# Altium footprint library PassiveComponents.PcbLib: 111 footprints (part 6 of 7)
Each footprint in its own frame and in the unit in brackets; x right, y up, seen from the top. Pads: shape width x height; smd on the part's side, far side on the other; paste and mask are expansions set on the pad; w line width, h text height; cw(c..) or ccw(c..) is an arc to the next point about the centre after c.
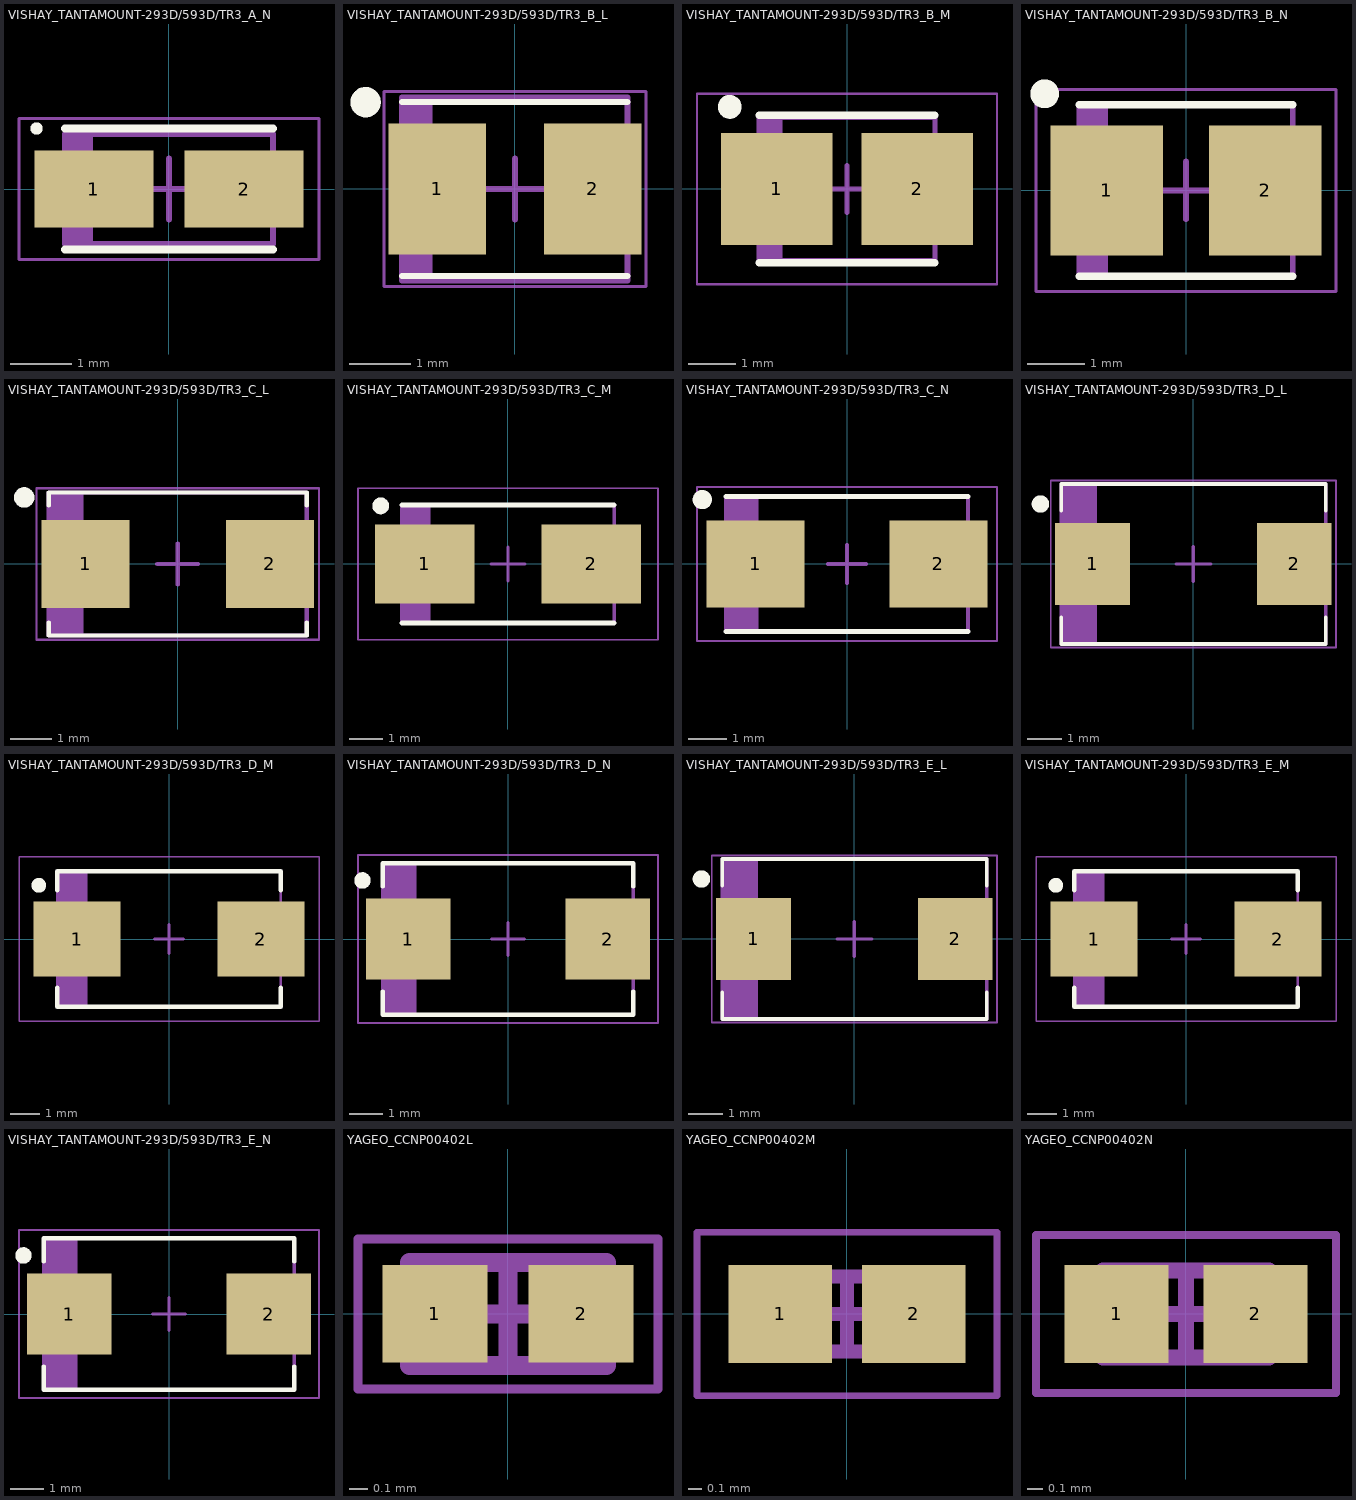
[diagram p5: the footprints below, top view; thin cyan lines are the x and y axes]

## VISHAY_TANTAMOUNT-293D/593D/TR3_A_N [mm] "Molded Capacitor, 2-Leads, Body 3.20x1.60mm, IPC Medium Density"
height 1.8
pads (2):
  rect 1.95x1.25 smd mask+0.05: 1(-1.225,0) 2(1.225,0)
Top Overlay:
  circle w0.1: c-2.163,0.988 r0.05
  lines w0.127: -1.7,-0.989 1.7,-0.989 ; -1.7,0.989 1.7,0.989
Top Assembly:
  rectangle: -1.7,-0.9 -1.243,0.9
  lines w0.1: -1.7,-0.9 -1.7,0.9 1.7,0.9 1.7,-0.9 -1.7,-0.9
  text "'.Designator'" at -1.209,-0.113 h0.5
Top Courtyard:
  lines w0.05: -2.45,-1.15 -2.45,1.15 2.45,1.15 2.45,-1.15 -2.45,-1.15
  lines w0.1: -0.5,0 0.5,0 ; 0,-0.5 0,0.5
3D body "CAPMP3216X18N.step": height 1.8, standoff 0, extent -1.92,-0.9 1.92,0.9

## VISHAY_TANTAMOUNT-293D/593D/TR3_B_L [mm] "Molded Capacitor, 2-Leads, Body 3.50x2.80mm, IPC High Density"
height 2.1
pads (2):
  rect 1.6x2.15 smd mask+0.05: 1(-1.275,0) 2(1.275,0)
Top Overlay:
  circle w0.25: c-2.451,1.426 r0.125
  lines w0.102: -1.85,-1.426 1.85,-1.426 ; -1.85,1.426 1.85,1.426
Top Assembly:
  rectangle: -1.85,-1.5 -1.352,1.5
  lines w0.1: -1.85,-1.5 -1.85,1.5 1.85,1.5 1.85,-1.5 -1.85,-1.5
  text "'.Designator'" at -1.209,-0.113 h0.5
Top Courtyard:
  lines w0.05: -2.15,-1.6 -2.15,1.6 2.15,1.6 2.15,-1.6 -2.15,-1.6
  lines w0.1: -0.5,0 0.5,0 ; 0,-0.5 0,0.5
3D body "CAPMP3528X21L.step": height 2.1, standoff 0, extent -2.07,-1.5 2.07,1.5

## VISHAY_TANTAMOUNT-293D/593D/TR3_B_M [mm] "Molded Capacitor, 2-Leads, Body 3.50x2.80mm, IPC Low Density"
height 2.1
pads (2):
  rect 2.35x2.35 smd mask+0.05: 1(-1.475,0) 2(1.475,0)
Top Overlay:
  circle w0.25: c-2.464,1.725 r0.125
  lines w0.152: -1.85,-1.551 1.85,-1.551 ; -1.85,1.551 1.85,1.551
Top Assembly:
  rectangle: -1.85,-1.5 -1.352,1.5
  lines w0.1: -1.85,-1.5 1.85,-1.5 1.85,1.5 -1.85,1.5 -1.85,-1.5
  text "'.Designator'" at -1.209,-0.113 h0.5
Top Courtyard:
  lines w0.05: -3.15,-2 3.15,-2 3.15,2 -3.15,2 -3.15,-2
  lines w0.1: -0.5,0 0.5,0 ; 0,-0.5 0,0.5
3D body "CAPMP3528X21M.step": height 2.1, standoff 0, extent -2.07,-1.5 2.07,1.5

## VISHAY_TANTAMOUNT-293D/593D/TR3_B_N [mm] "Molded Capacitor, 2-Leads, Body 3.50x2.80mm, IPC Medium Density"
height 2.1
pads (2):
  rect 1.95x2.25 smd mask+0.05: 1(-1.375,0) 2(1.375,0)
Top Overlay:
  circle w0.25: c-2.449,1.675 r0.125
  lines w0.127: -1.85,-1.488 1.85,-1.488 ; -1.85,1.488 1.85,1.488
Top Assembly:
  rectangle: -1.85,-1.5 -1.352,1.5
  lines w0.1: -1.85,-1.5 1.85,-1.5 1.85,1.5 -1.85,1.5 -1.85,-1.5
  text "'.Designator'" at -1.209,-0.113 h0.5
Top Courtyard:
  lines w0.05: -2.6,-1.75 2.6,-1.75 2.6,1.75 -2.6,1.75 -2.6,-1.75
  lines w0.1: -0.5,0 0.5,0 ; 0,-0.5 0,0.5
3D body "CAPMP3528X21N.step": height 2.1, standoff 0, extent -2.07,-1.5 2.07,1.5

## VISHAY_TANTAMOUNT-293D/593D/TR3_C_L [mm] "Molded Capacitor, 2-Leads, Body 6.00x3.20mm, IPC High Density"
height 2.8
pads (2):
  rect 2.15x2.15 smd mask+0.05: 1(-2.25,0) 2(2.25,0)
Top Overlay:
  circle w0.25: c-3.751,1.625 r0.125
  lines w0.102: -3.15,-1.426 -3.15,-1.75 3.15,-1.75 3.15,-1.426 ; -3.15,1.426 -3.15,1.75 3.15,1.75 3.15,1.426
Top Assembly:
  rectangle: -3.15,-1.75 -2.303,1.75
  lines w0.1: -3.15,-1.75 -3.15,1.75 3.15,1.75 3.15,-1.75 -3.15,-1.75
  text "'.Designator'" at -1.209,-0.113 h0.5
Top Courtyard:
  lines w0.05: -3.45,-1.85 -3.45,1.85 3.45,1.85 3.45,-1.85 -3.45,-1.85
  lines w0.1: -0.5,0 0.5,0 ; 0,-0.5 0,0.5
3D body "CAPMP6032X28L.step": height 2.8, standoff 0, extent -3.37,-1.75 3.37,1.75

## VISHAY_TANTAMOUNT-293D/593D/TR3_C_M [mm] "Molded Capacitor, 2-Leads, Body 6.00x3.20mm, IPC Low Density"
height 2.8
pads (2):
  rect 2.95x2.35 smd mask+0.05: 1(-2.475,0) 2(2.475,0)
Top Overlay:
  circle w0.25: c-3.776,1.725 r0.125
  lines w0.152: -3.15,-1.75 3.15,-1.75 ; -3.15,1.75 3.15,1.75
Top Assembly:
  rectangle: -3.15,-1.75 -2.303,1.75
  lines w0.1: -3.15,-1.75 3.15,-1.75 3.15,1.75 -3.15,1.75 -3.15,-1.75
  text "'.Designator'" at -1.209,-0.113 h0.5
Top Courtyard:
  lines w0.05: -4.45,-2.25 4.45,-2.25 4.45,2.25 -4.45,2.25 -4.45,-2.25
  lines w0.1: -0.5,0 0.5,0 ; 0,-0.5 0,0.5
3D body "CAPMP6032X28M.step": height 2.8, standoff 0, extent -3.37,-1.75 3.37,1.75

## VISHAY_TANTAMOUNT-293D/593D/TR3_C_N [mm] "Molded Capacitor, 2-Leads, Body 6.00x3.20mm, IPC Medium Density"
height 2.8
pads (2):
  rect 2.55x2.25 smd mask+0.05: 1(-2.375,0) 2(2.375,0)
Top Overlay:
  circle w0.25: c-3.763,1.675 r0.125
  lines w0.127: -3.15,-1.75 3.15,-1.75 ; -3.15,1.75 3.15,1.75
Top Assembly:
  rectangle: -3.15,-1.75 -2.303,1.75
  lines w0.1: -3.15,-1.75 -3.15,1.75 3.15,1.75 3.15,-1.75 -3.15,-1.75
  text "'.Designator'" at -1.209,-0.113 h0.5
Top Courtyard:
  lines w0.05: -3.9,-2 -3.9,2 3.9,2 3.9,-2 -3.9,-2
  lines w0.1: -0.5,0 0.5,0 ; 0,-0.5 0,0.5
3D body "CAPMP6032X28N.step": height 2.8, standoff 0, extent -3.32,-1.7 3.32,1.7

## VISHAY_TANTAMOUNT-293D/593D/TR3_D_L [mm] "Molded Capacitor, 2-Leads, Body 7.30x4.30mm, IPC High Density"
height 3.1
pads (2):
  rect 2.15x2.35 smd mask+0.05: 1(-2.9,0) 2(2.9,0)
Top Overlay:
  circle w0.25: c-4.401,1.725 r0.125
  lines w0.102: -3.8,-1.526 -3.8,-2.3 3.8,-2.3 3.8,-1.526 ; -3.8,1.526 -3.8,2.3 3.8,2.3 3.8,1.526
Top Assembly:
  rectangle: -3.8,-2.3 -2.778,2.3
  lines w0.1: -3.8,-2.3 3.8,-2.3 3.8,2.3 -3.8,2.3 -3.8,-2.3
  text "'.Designator'" at -1.209,-0.113 h0.5
Top Courtyard:
  lines w0.05: -4.1,-2.4 4.1,-2.4 4.1,2.4 -4.1,2.4 -4.1,-2.4
  lines w0.1: -0.5,0 0.5,0 ; 0,-0.5 0,0.5
3D body "CAPMP7343X31L.step": height 3.1, standoff 0, extent -4.02,-2.3 4.02,2.3

## VISHAY_TANTAMOUNT-293D/593D/TR3_D_M [mm] "Molded Capacitor, 2-Leads, Body 7.30x4.30mm, IPC Low Density"
height 3.1
pads (2):
  rect 2.95x2.55 smd mask+0.05: 1(-3.125,0) 2(3.125,0)
Top Overlay:
  circle w0.25: c-4.426,1.825 r0.125
  lines w0.152: -3.8,-1.651 -3.8,-2.3 3.8,-2.3 3.8,-1.651 ; -3.8,1.651 -3.8,2.3 3.8,2.3 3.8,1.651
Top Assembly:
  rectangle: -3.8,-2.3 -2.778,2.3
  lines w0.1: -3.8,-2.3 -3.8,2.3 3.8,2.3 3.8,-2.3 -3.8,-2.3
  text "'.Designator'" at -1.209,-0.113 h0.5
Top Courtyard:
  lines w0.05: -5.1,-2.8 -5.1,2.8 5.1,2.8 5.1,-2.8 -5.1,-2.8
  lines w0.1: -0.5,0 0.5,0 ; 0,-0.5 0,0.5
3D body "CAPMP7343X31M.step": height 3.1, standoff 0, extent -3.97,-2.2 3.97,2.2

## VISHAY_TANTAMOUNT-293D/593D/TR3_D_N [mm] "Molded Capacitor, 2-Leads, Body 7.30x4.30mm, IPC Medium Density"
height 3.1
pads (2):
  rect 2.55x2.45 smd mask+0.05: 1(-3.025,0) 2(3.025,0)
Top Overlay:
  circle w0.25: c-4.414,1.775 r0.125
  lines w0.127: -3.8,-1.588 -3.8,-2.3 3.8,-2.3 3.8,-1.588 ; -3.8,1.588 -3.8,2.3 3.8,2.3 3.8,1.588
Top Assembly:
  rectangle: -3.8,-2.3 -2.778,2.3
  lines w0.1: -3.8,-2.3 3.8,-2.3 3.8,2.3 -3.8,2.3 -3.8,-2.3
  text "'.Designator'" at -1.209,-0.113 h0.5
Top Courtyard:
  lines w0.05: -4.55,-2.55 4.55,-2.55 4.55,2.55 -4.55,2.55 -4.55,-2.55
  lines w0.1: -0.5,0 0.5,0 ; 0,-0.5 0,0.5
3D body "CAPMP7343X31N.step": height 3.1, standoff 0, extent -4.02,-2.3 4.02,2.3

## VISHAY_TANTAMOUNT-293D/593D/TR3_E_L [mm] "Molded Capacitor, 2-Leads, Body 7.30x4.30mm, IPC High Density"
height 4.3
pads (2):
  rect 2.15x2.35 smd mask+0.05: 1(-2.9,0) 2(2.9,0)
Top Overlay:
  circle w0.25: c-4.401,1.725 r0.125
  lines w0.102: -3.8,-1.526 -3.8,-2.3 3.8,-2.3 3.8,-1.526 ; -3.8,1.526 -3.8,2.3 3.8,2.3 3.8,1.526
Top Assembly:
  rectangle: -3.8,-2.3 -2.778,2.3
  lines w0.1: -3.8,-2.3 3.8,-2.3 3.8,2.3 -3.8,2.3 -3.8,-2.3
  text "'.Designator'" at -1.209,-0.113 h0.5
Top Courtyard:
  lines w0.05: -4.1,-2.4 4.1,-2.4 4.1,2.4 -4.1,2.4 -4.1,-2.4
  lines w0.1: -0.5,0 0.5,0 ; 0,-0.5 0,0.5
3D body "CAPMP7343X43L.step": height 4.3, standoff 0, extent -4.02,-2.3 4.02,2.3

## VISHAY_TANTAMOUNT-293D/593D/TR3_E_M [mm] "Molded Capacitor, 2-Leads, Body 7.30x4.30mm, IPC Low Density"
height 4.3
pads (2):
  rect 2.95x2.55 smd mask+0.05: 1(-3.125,0) 2(3.125,0)
Top Overlay:
  circle w0.25: c-4.426,1.825 r0.125
  lines w0.152: -3.8,-1.651 -3.8,-2.3 3.8,-2.3 3.8,-1.651 ; -3.8,1.651 -3.8,2.3 3.8,2.3 3.8,1.651
Top Assembly:
  rectangle: -3.8,-2.3 -2.778,2.3
  lines w0.1: -3.8,-2.3 -3.8,2.3 3.8,2.3 3.8,-2.3 -3.8,-2.3
  text "'.Designator'" at -1.209,-0.113 h0.5
Top Courtyard:
  lines w0.05: -5.1,-2.8 -5.1,2.8 5.1,2.8 5.1,-2.8 -5.1,-2.8
  lines w0.1: -0.5,0 0.5,0 ; 0,-0.5 0,0.5
3D body "CAPMP7343X43M.step": height 4.3, standoff 0, extent -4.02,-2.3 4.02,2.3

## VISHAY_TANTAMOUNT-293D/593D/TR3_E_N [mm] "Molded Capacitor, 2-Leads, Body 7.30x4.30mm, IPC Medium Density"
height 4.3
pads (2):
  rect 2.55x2.45 smd mask+0.05: 1(-3.025,0) 2(3.025,0)
Top Overlay:
  circle w0.25: c-4.414,1.775 r0.125
  lines w0.127: -3.8,-1.588 -3.8,-2.3 3.8,-2.3 3.8,-1.588 ; -3.8,1.588 -3.8,2.3 3.8,2.3 3.8,1.588
Top Assembly:
  rectangle: -3.8,-2.3 -2.778,2.3
  lines w0.1: -3.8,-2.3 -3.8,2.3 3.8,2.3 3.8,-2.3 -3.8,-2.3
  text "'.Designator'" at -1.209,-0.113 h0.5
Top Courtyard:
  lines w0.05: -4.55,-2.55 -4.55,2.55 4.55,2.55 4.55,-2.55 -4.55,-2.55
  lines w0.1: -0.5,0 0.5,0 ; 0,-0.5 0,0.5
3D body "CAPMP7343X43N.step": height 4.3, standoff 0, extent -4.02,-2.3 4.02,2.3

## YAGEO_CCNP00402L [mm] "Chip Capacitor, 2-Leads, Body 1.00x0.50mm, IPC High Density"
height 0.55
pads (2):
  rect 0.56x0.52 smd mask+0.05: 1(-0.39,0) 2(0.39,0)
Top Assembly:
  lines w0.1: -0.525,-0.275 -0.525,0.275 0.525,0.275 0.525,-0.275 -0.525,-0.275
  text "'.Designator'" at -0.483,-0.045 h0.2
Top Courtyard:
  lines w0.05: -0.8,-0.4 -0.8,0.4 0.8,0.4 0.8,-0.4 -0.8,-0.4
  lines w0.1: -0.275,0 0.275,0 ; 0,-0.275 0,0.275
3D body "CAPC1005X06L.step": height 0.55, standoff 0, extent -0.525,-0.275 0.525,0.275

## YAGEO_CCNP00402M [mm] "Chip Capacitor, 2-Leads, Body 1.00x0.50mm, IPC Low Density"
height 0.55
pads (2):
  rect 0.76x0.72 smd mask+0.05: 1(-0.49,0) 2(0.49,0)
Top Assembly:
  lines w0.1: -0.525,-0.275 0.525,-0.275 0.525,0.275 -0.525,0.275 -0.525,-0.275
  text "'.Designator'" at -0.483,-0.045 h0.2
Top Courtyard:
  lines w0.05: -1.1,-0.6 1.1,-0.6 1.1,0.6 -1.1,0.6 -1.1,-0.6
  lines w0.1: -0.275,0 0.275,0 ; 0,-0.275 0,0.275
3D body "CAPC1005X06M.step": height 0.55, standoff 0, extent -0.525,-0.275 0.525,0.275

## YAGEO_CCNP00402N [mm] "Chip Capacitor, 2-Leads, Body 1.00x0.50mm, IPC Medium Density"
height 0.55
pads (2):
  rect 0.66x0.62 smd mask+0.05: 1(-0.44,0) 2(0.44,0)
Top Assembly:
  lines w0.1: -0.525,-0.275 0.525,-0.275 0.525,0.275 -0.525,0.275 -0.525,-0.275
  text "'.Designator'" at -0.483,-0.045 h0.2
Top Courtyard:
  lines w0.05: -0.95,-0.5 0.95,-0.5 0.95,0.5 -0.95,0.5 -0.95,-0.5
  lines w0.1: -0.275,0 0.275,0 ; 0,-0.275 0,0.275
3D body "CAPC1005X06N.step": height 0.55, standoff 0, extent -0.525,-0.275 0.525,0.275